# Altium footprint library CPU_STM.PcbLib: 216 footprints (part 11 of 15)
Each footprint in its own frame and in the unit in brackets; x right, y up, seen from the top. Pads: shape width x height; smd on the part's side, far side on the other; paste and mask are expansions set on the pad; w line width, h text height; cw(c..) or ccw(c..) is an arc to the next point about the centre after c.
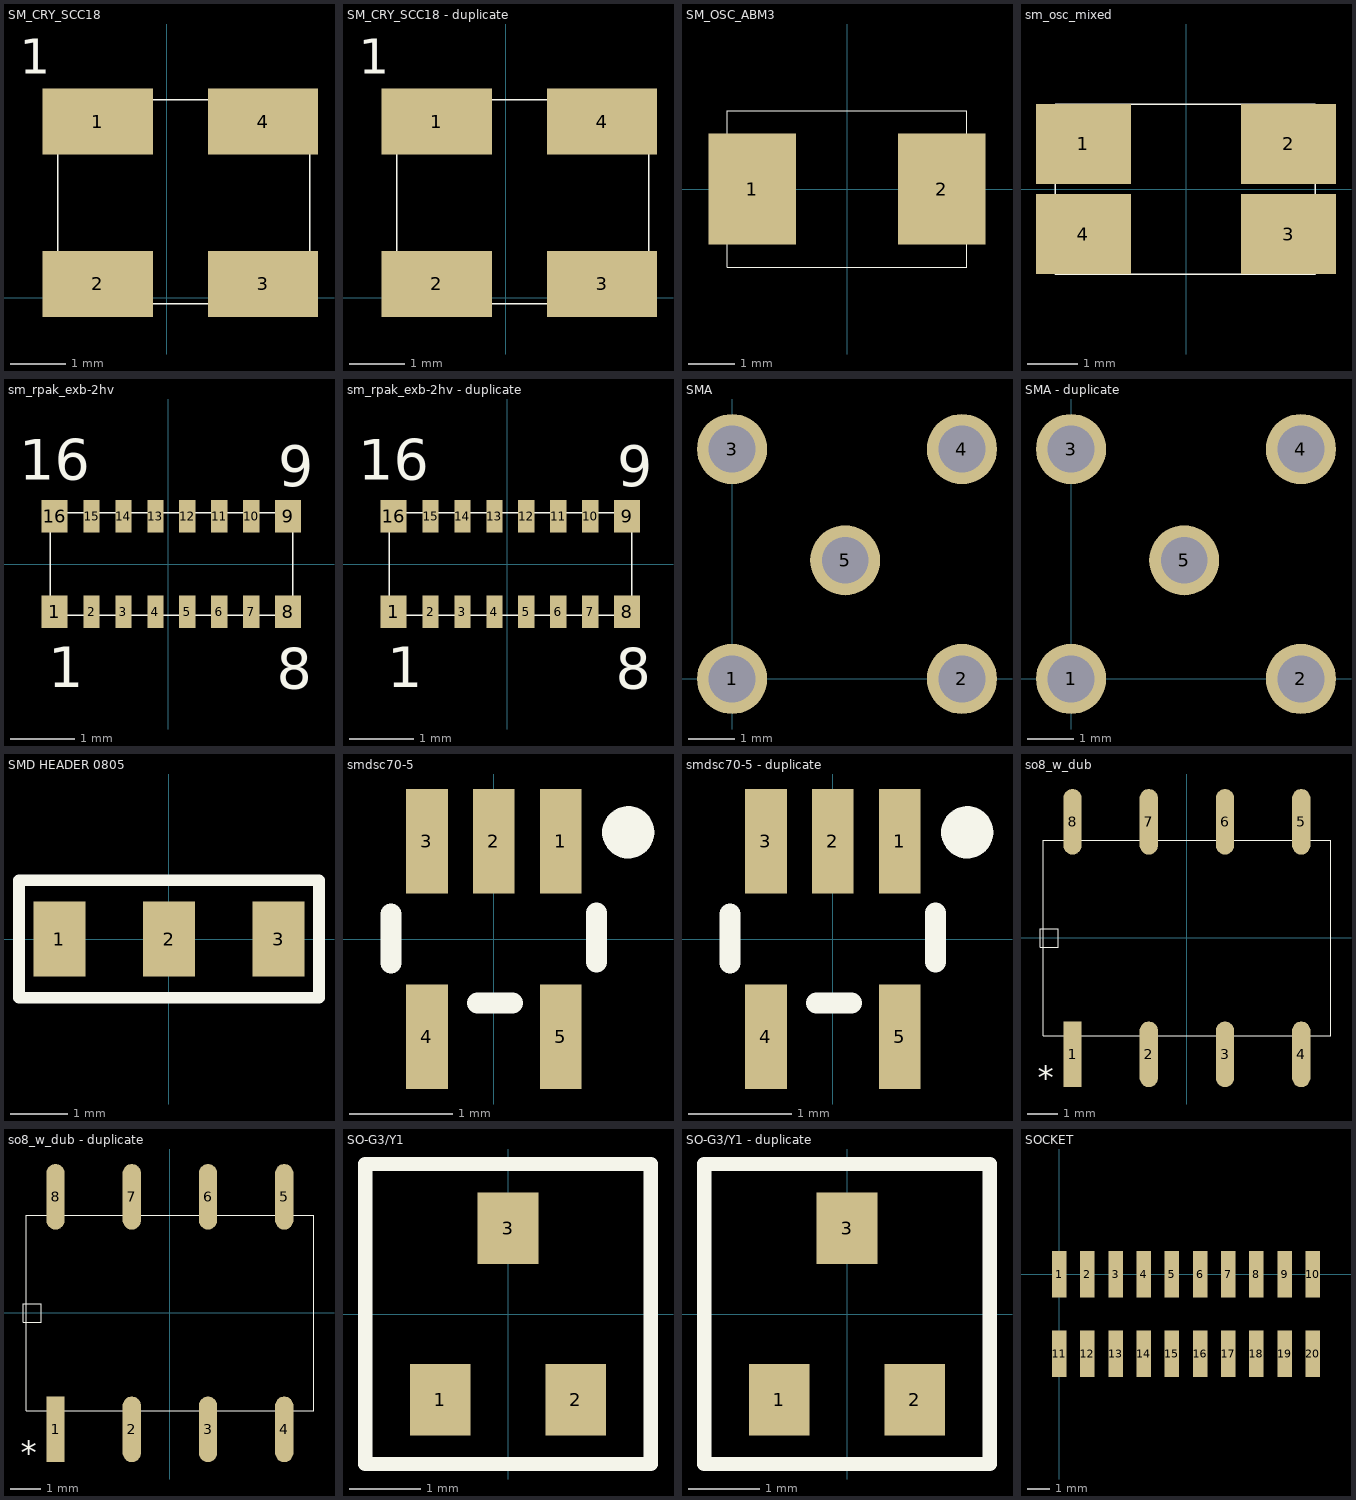
[diagram p10: the footprints below, top view; thin cyan lines are the x and y axes]

## SM_CRY_SCC18 [mm] "SM_CRY_SCC18"
pads (4):
  rect 2x1.2 smd: 1(-1.25,3.2) 2(-1.25,0.254) 3(1.75,0.254) 4(1.75,3.2)
Top Overlay:
  lines w0.025: -1.981,-0.102 2.6,-0.102 2.6,3.6 -1.981,3.6 -1.981,-0.102
  text "1" at -2.667,4.064 h0.64

## SM_CRY_SCC18 - duplicate [mm] "SM_CRY_SCC18"
pads (4):
  rect 2x1.2 smd: 1(-1.25,3.2) 2(-1.25,0.254) 3(1.75,0.254) 4(1.75,3.2)
Top Overlay:
  lines w0.025: -1.981,-0.102 -1.981,3.6 2.6,3.6 2.6,-0.102 -1.981,-0.102
  text "1" at -2.667,4.064 h0.64

## SM_OSC_ABM3 [mm] "SM_OSC_ABM3"
pads (2):
  rect 1.9x2.4 smd: 1(-2.05,0) 2(2.05,0)
Top Overlay:
  lines w0.025: -2.6,-1.7 -2.6,1.7 2.6,1.7 2.6,-1.7 -2.6,-1.7
3D body "User Library-Xtal-ABM7.STEP": height 1.44, standoff 0.04, extent -3.075,-1.85 3.125,1.85

## sm_osc_mixed [mm]
pads (4):
  rect 1.9x1.6 smd: 1(-2.05,0.9) 2(2.05,0.9) 3(2.05,-0.9) 4(-2.05,-0.9)
Top Overlay:
  lines w0.025: -2.618,-1.701 -2.618,1.699 2.582,1.699 2.582,-1.701 -2.618,-1.701
3D body "User Library-Xtal-ABM7.STEP": height 1.44, standoff 0.04, extent -3.1,-1.854 3.1,1.846

## sm_rpak_exb-2hv [mil] "SM_RPAK_EXB-2HV"
pads (16):
  rect 16x20 smd mask+2.36: 1(-70.08,-29.53) 8(74.02,-29.53) 9(74.02,29.53) 16(-70.08,29.53)
  rect 10x20 smd mask+2.36: 2(-47.24,-29.53) 3(-27.56,-29.53) 4(-7.87,-29.53) 5(11.81,-29.53) 6(31.5,-29.53) 7(51.18,-29.53) 10(51.18,29.53) 11(31.5,29.53) 12(11.81,29.53) 13(-7.87,29.53) 14(-27.56,29.53) 15(-47.24,29.53)
Top Overlay:
  lines w1: -72.83,-31.5 -72.83,31.5 76.77,31.5 76.77,-31.5 -72.83,-31.5
  text "1" at -74,-76 h25
  text "8" at 67,-77 h25
  text "9" at 68,48 h25
  text "16" at -92,52 h25

## sm_rpak_exb-2hv - duplicate [mil] "SM_RPAK_EXB-2HV"
pads (16):
  rect 16x20 smd mask+2.36: 1(-70.08,-29.53) 8(74.02,-29.53) 9(74.02,29.53) 16(-70.08,29.53)
  rect 10x20 smd mask+2.36: 2(-47.24,-29.53) 3(-27.56,-29.53) 4(-7.87,-29.53) 5(11.81,-29.53) 6(31.5,-29.53) 7(51.18,-29.53) 10(51.18,29.53) 11(31.5,29.53) 12(11.81,29.53) 13(-7.87,29.53) 14(-27.56,29.53) 15(-47.24,29.53)
Top Overlay:
  lines w1: -72.83,-31.5 76.77,-31.5 76.77,31.5 -72.83,31.5 -72.83,-31.5
  text "16" at -92,52 h25
  text "9" at 68,48 h25
  text "8" at 67,-77 h25
  text "1" at -74,-76 h25

## SMA [mil]
pads (5):
  round 60 hole 40: 1(0,0) 2(196.85,0) 3(0,196.85) 4(196.85,196.85) 5(96.85,101.57)
3D body "SMA-J-P-H-RA-TH1.step": height 427.56, standoff -127.75, extent -40.95,-36.22 553.54,239.37

## SMA - duplicate [mil]
pads (5):
  round 60 hole 40: 1(0,0) 2(196.85,0) 3(0,196.85) 4(196.85,196.85) 5(96.85,101.57)

## SMD HEADER 0805 [mm]
pads (3):
  rect 0.9x1.3 smd: 1(-1.9,0) 2(0,0) 3(1.9,0)
Top Overlay:
  lines w0.2: -2.6,-1.016 -2.6,1.016 2.6,1.016 2.6,-1.016 -2.6,-1.016
3D body "User Library-RES_2013-0805.step": height 0.76, standoff 0, extent -2.1,-0.675 0.2,0.675

## smdsc70-5 [mil] "SMDSC70-5"
pads (5):
  rect 16x40 smd mask+2.36: 1(25.59,37.4) 2(0,37.4) 3(-25.59,37.4) 4(-25.59,-37.4) 5(25.59,-37.4)
Top Overlay:
  circle w10: c51.45,40.82 r5
  lines w8: -39.4,-9.22 -39.4,9.61 ; -6.18,-24.52 7.17,-24.52 ; 39.34,-8.81 39.34,10.02

## smdsc70-5 - duplicate [mil] "SMDSC70-5"
pads (5):
  rect 16x40 smd mask+2.36: 1(25.59,37.4) 2(0,37.4) 3(-25.59,37.4) 4(-25.59,-37.4) 5(25.59,-37.4)
Top Overlay:
  circle w10: c51.45,40.82 r5
  lines w8: -39.4,-9.22 -39.4,9.61 ; -6.18,-24.52 7.17,-24.52 ; 39.34,-8.81 39.34,10.02

## so8_w_dub [mil] "SO8_W_DUB"
pads (8):
  rect 24x86 smd: 1(-150,-152.75)
  oval 24x86 smd: 2(-50,-152.75) 3(50,-152.75) 4(150,-152.75) 5(150,152.25) 6(50,152.25) 7(-50,152.25) 8(-150,152.25)
Top Overlay:
  lines w1: -192.5,-12.25 -168.5,-12.25 -168.5,11.75 -192.5,11.75 -192.5,-12.25 ; -188.5,-128.25 172.83,-128.7 188.5,-128.25 188.5,127.75 -188.5,127.75 -188.5,-128.25
  text "*" at -195.4,-198.25 h31

## so8_w_dub - duplicate [mil] "SO8_W_DUB"
pads (8):
  rect 24x86 smd: 1(-150,-152.75)
  oval 24x86 smd: 2(-50,-152.75) 3(50,-152.75) 4(150,-152.75) 5(150,152.25) 6(50,152.25) 7(-50,152.25) 8(-150,152.25)
Top Overlay:
  lines w1: -192.5,-12.25 -168.5,-12.25 -168.5,11.75 -192.5,11.75 -192.5,-12.25 ; -188.5,-128.25 172.83,-128.7 188.5,-128.25 188.5,127.75 -188.5,127.75 -188.5,-128.25
  text "*" at -195.4,-198.25 h31

## SO-G3/Y1 [mm]
pads (3):
  rect 0.85x1 smd: 1(-0.95,-1.2) 2(0.95,-1.2) 3(0,1.2)
Top Overlay:
  lines w0.2: -2,-2.1 2,-2.1 2,2.1 -2,2.1 -2,-2.1

## SO-G3/Y1 - duplicate [mm]
pads (3):
  rect 0.85x1 smd: 1(-0.95,-1.2) 2(0.95,-1.2) 3(0,1.2)
Top Overlay:
  lines w0.2: -2,-2.1 2,-2.1 2,2.1 -2,2.1 -2,-2.1

## SOCKET [mm]
pads (20):
  rect 0.65x2.1 smd: 1(0,0) 2(1.27,0) 3(2.54,0) 4(3.81,0) 5(5.08,0) 6(6.35,0) 7(7.62,0) 8(8.89,0) 9(10.16,0) 10(11.43,0) 11(0,-3.6) 12(1.27,-3.6) 13(2.54,-3.6) 14(3.81,-3.6) 15(5.08,-3.6) 16(6.35,-3.6) 17(7.62,-3.6) 18(8.89,-3.6) 19(10.16,-3.6) 20(11.43,-3.6)